# Altium footprint library vmorais_libraries.PcbLib: 80 footprints (part 4 of 5)
Each footprint in its own frame and in the unit in brackets; x right, y up, seen from the top. Pads: shape width x height; smd on the part's side, far side on the other; paste and mask are expansions set on the pad; w line width, h text height; cw(c..) or ccw(c..) is an arc to the next point about the centre after c.
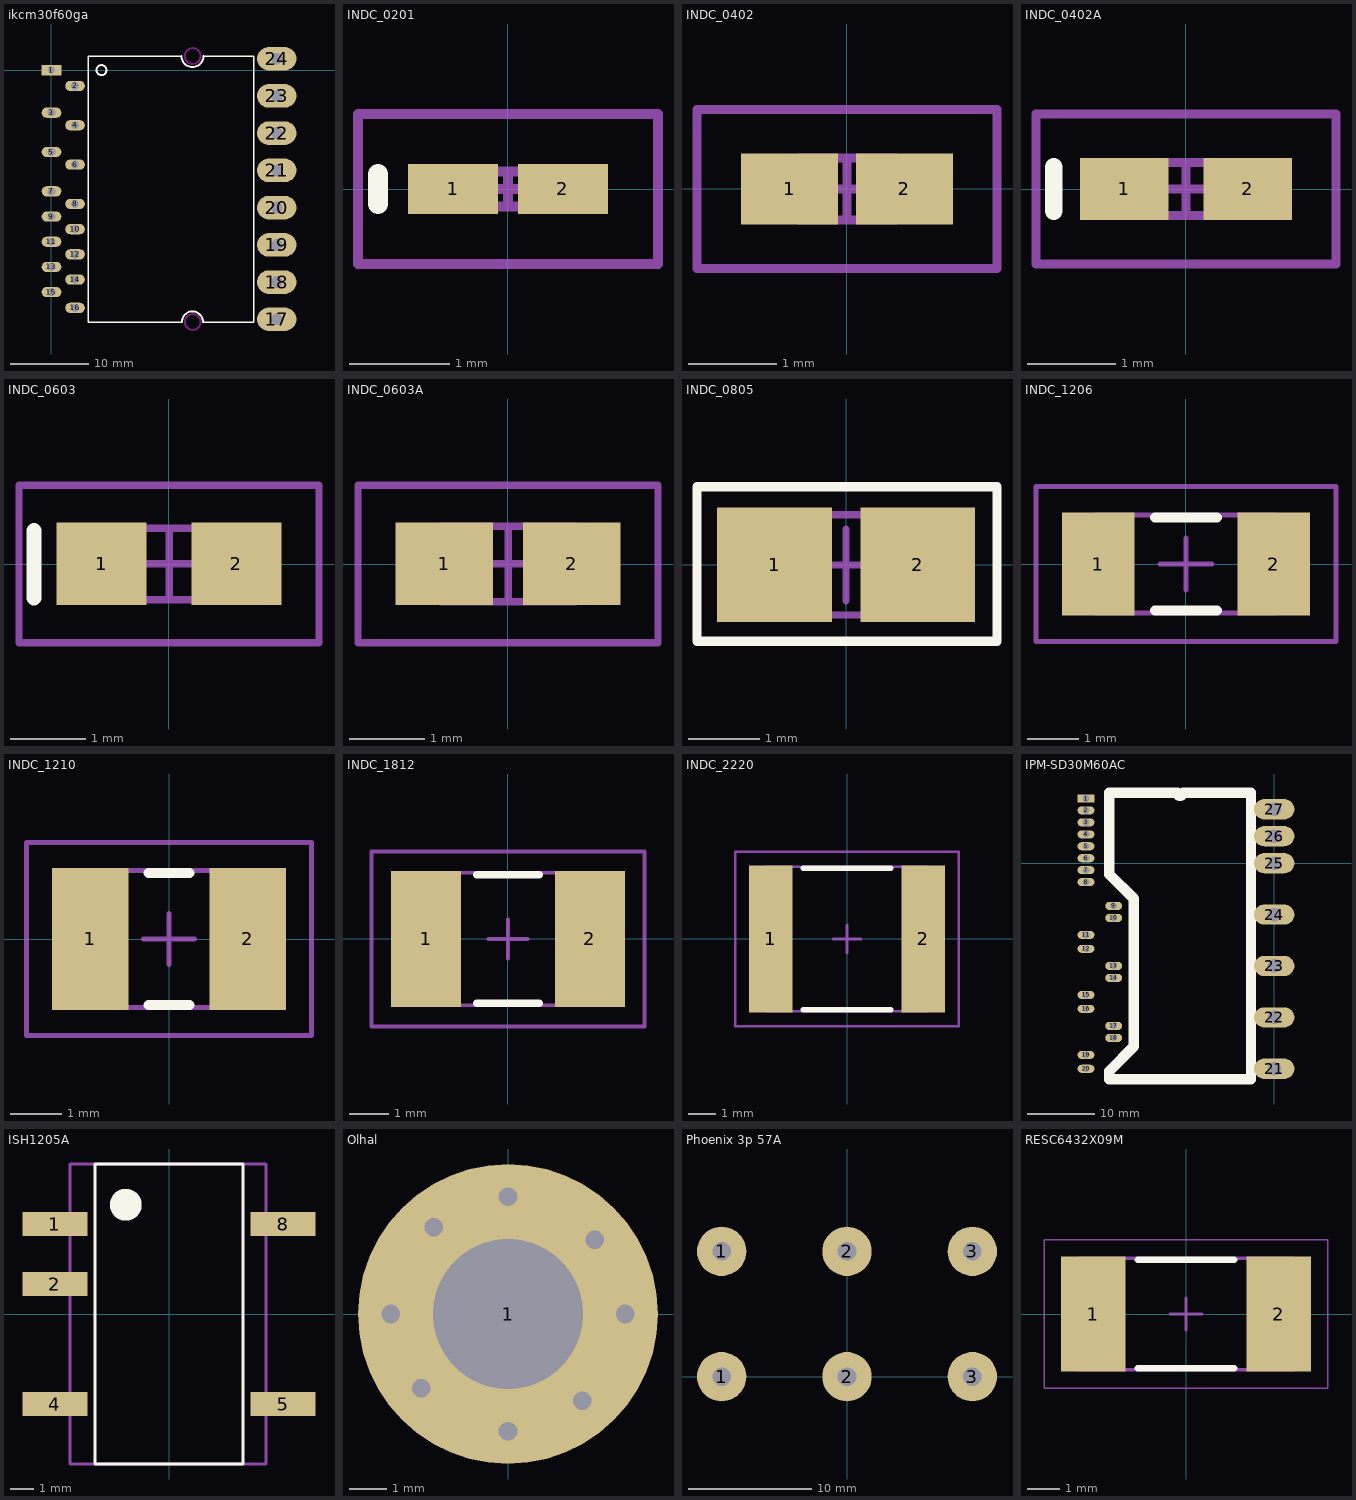
[diagram p3: the footprints below, top view; thin cyan lines are the x and y axes]

## ikcm30f60ga [mm]
pads (24):
  rect 2.5x1.3 hole 0.9: 1(0,0)
  oval 2.5x1.3 hole 1: 2(2.997,-2) 3(0,-5.4) 4(2.997,-7) 5(0,-10.4) 6(2.997,-12) 7(0,-15.4) 8(2.997,-17) 9(0,-18.6) 10(2.997,-20.2) 11(0,-21.8) 12(2.997,-23.4) 13(0,-25) 14(2.997,-26.6) 15(0,-28.2) 16(2.997,-30.2)
  oval 5x3 hole 1.5: 17(28.611,-31.655) 18(28.611,-26.925) 19(28.611,-22.195) 20(28.611,-17.465) 21(28.611,-12.735) 22(28.611,-8.005) 23(28.611,-3.275) 24(28.611,1.455)
Top Layer keep-out:
  circle w0.254: c17.95,1.8 r1
  circle w0.254: c17.95,-32 r1
Top Overlay:
  circle w0.254: c6.35,0 r0.635
  lines w0.2: 16.51,1.778 4.699,1.778 4.699,-32.004 16.557,-32.004 ; 19.257,-32.004 25.699,-32.004 25.699,1.778 19.304,1.778
  lines w0.254: 16.51,1.778 ccw(c17.907,1.778) 19.304,1.778 ; 16.557,-32.004 cw(c17.907,-32.004) 19.257,-32.004
3D body "User Library-Cipos-mini-PCB.STEP": height 1.3, standoff -6.4, extent -0.674,-33.198 29.159,3.102

## INDC_0201 [mm] "Chip Inductor, Body 0.6x0.3mm, IPC Low Density"
height 0.35
pads (2):
  rect 0.9x0.5 smd: 1(-0.55,0) 2(0.55,0)
Top Overlay:
  lines w0.2: -1.3,-0.15 -1.3,0.15
Mechanical 13:
  lines w0.1: -0.325,-0.175 -0.325,0.175 0.325,0.175 0.325,-0.175 -0.325,-0.175
Mechanical 15:
  lines w0.1: -0.175,0 0.175,0 ; 0,-0.175 0,0.175 ; -1.5,-0.75 -1.5,0.75 1.5,0.75 1.5,-0.75 -1.5,-0.75
3D body: height 0.35, standoff 0, extent -0.325,-0.175 0.325,0.175

## INDC_0402 [mm] "Chip Inductor, Body 1.0x0.5mm, IPC Low Density"
height 0.6
pads (2):
  rect 1.1x0.8 smd: 1(-0.65,0) 2(0.65,0)
Mechanical 13:
  lines w0.1: -0.55,-0.35 -0.55,0.35 0.55,0.35 0.55,-0.35 -0.55,-0.35
Mechanical 15:
  lines w0.1: -0.35,0 0.35,0 ; 0,-0.35 0,0.35 ; -1.7,-0.9 -1.7,0.9 1.7,0.9 1.7,-0.9 -1.7,-0.9
3D body: height 0.6, standoff 0, extent -0.55,-0.35 0.55,0.35

## INDC_0402A [mm] "Chip Inductor, Body 1.0x0.5mm, IPC Low Density"
height 0.55
pads (2):
  rect 1x0.7 smd: 1(-0.7,0) 2(0.7,0)
Top Overlay:
  lines w0.2: -1.5,-0.25 -1.5,0.25
Mechanical 13:
  lines w0.1: -0.55,-0.3 -0.55,0.3 0.55,0.3 0.55,-0.3 -0.55,-0.3
Mechanical 15:
  lines w0.1: -0.3,0 0.3,0 ; 0,-0.3 0,0.3 ; -1.7,-0.85 -1.7,0.85 1.7,0.85 1.7,-0.85 -1.7,-0.85
3D body: height 0.55, standoff 0, extent -0.55,-0.3 0.55,0.3

## INDC_0603 [mm] "Chip Inductor, Body 1.6x0.8mm, IPC Low Density"
height 0.71
pads (2):
  rect 1.2x1.1 smd: 1(-0.9,0) 2(0.9,0)
Top Overlay:
  lines w0.2: -1.8,-0.45 -1.8,0.45
Mechanical 13:
  lines w0.1: -0.875,-0.475 -0.875,0.475 0.875,0.475 0.875,-0.475 -0.875,-0.475
Mechanical 15:
  lines w0.1: -0.475,0 0.475,0 ; 0,-0.475 0,0.475 ; -2,-1.05 -2,1.05 2,1.05 2,-1.05 -2,-1.05
3D body: height 0.71, standoff 0, extent -0.875,-0.475 0.875,0.475

## INDC_0603A [mm] "Chip Inductor, Body 1.6x0.8mm, IPC Low Density"
height 1
pads (2):
  rect 1.3x1.1 smd: 1(-0.85,0) 2(0.85,0)
Mechanical 13:
  lines w0.1: -0.9,-0.5 0.9,-0.5 0.9,0.5 -0.9,0.5 -0.9,-0.5
Mechanical 15:
  lines w0.1: -0.5,0 0.5,0 ; 0,-0.5 0,0.5 ; -2,-1.05 2,-1.05 2,1.05 -2,1.05 -2,-1.05
3D body: height 1, standoff 0, extent -0.9,-0.5 0.9,0.5

## INDC_0805 [mm] "Chip Inductor, Body 2.0x1.2mm, IPC Low Density"
height 1.1
pads (2):
  rect 1.6x1.6 smd: 1(-1,0) 2(1,0)
Top Overlay:
  lines w0.127: -2.083,-1.067 -2.083,1.092 2.108,1.092 2.108,-1.067 -2.083,-1.067
Mechanical 13:
  lines w0.1: -1.1,-0.7 -1.1,0.7 1.1,0.7 1.1,-0.7 -1.1,-0.7
Mechanical 15:
  lines w0.1: -0.5,0 0.5,0 ; 0,-0.5 0,0.5
3D body: height 1.1, standoff 0, extent -1.1,-0.7 1.1,0.7

## INDC_1206 [mm] "Chip Inductor, Body 3.2x1.6mm, IPC Low Density"
height 1.9
pads (2):
  rect 1.4x2 smd: 1(-1.7,0) 2(1.7,0)
Top Overlay:
  lines w0.2: -0.6,-0.9 0.6,-0.9 ; -0.6,0.9 0.6,0.9
Mechanical 13:
  lines w0.1: -1.75,-0.95 1.75,-0.95 1.75,0.95 -1.75,0.95 -1.75,-0.95
Mechanical 15:
  lines w0.1: -0.5,0 0.5,0 ; 0,-0.5 0,0.5 ; -2.9,-1.5 2.9,-1.5 2.9,1.5 -2.9,1.5 -2.9,-1.5
3D body: height 1.9, standoff 0, extent -1.75,-0.95 1.75,0.95

## INDC_1210 [mm] "Chip Inductor, Body 3.2x2.5mm, IPC Low Density"
height 1.5
pads (2):
  rect 1.5x2.8 smd: 1(-1.55,0) 2(1.55,0)
Top Overlay:
  lines w0.2: -0.4,-1.3 0.4,-1.3 ; -0.4,1.3 0.4,1.3
Mechanical 13:
  lines w0.1: -1.7,-1.35 -1.7,1.35 1.7,1.35 1.7,-1.35 -1.7,-1.35
Mechanical 15:
  lines w0.1: -0.5,0 0.5,0 ; 0,-0.5 0,0.5 ; -2.8,-1.9 -2.8,1.9 2.8,1.9 2.8,-1.9 -2.8,-1.9
3D body: height 1.5, standoff 0, extent -1.7,-1.35 1.7,1.35

## INDC_1812 [mm] "Chip Inductor, Body 4.5x3.2mm, IPC Low Density"
height 1.35
pads (2):
  rect 1.8x3.5 smd: 1(-2.1,0) 2(2.1,0)
Top Overlay:
  lines w0.2: -0.8,-1.65 0.8,-1.65 ; -0.8,1.65 0.8,1.65
Mechanical 13:
  lines w0.1: -2.4,-1.7 2.4,-1.7 2.4,1.7 -2.4,1.7 -2.4,-1.7
Mechanical 15:
  lines w0.1: -0.5,0 0.5,0 ; 0,-0.5 0,0.5 ; -3.5,-2.25 3.5,-2.25 3.5,2.25 -3.5,2.25 -3.5,-2.25
3D body: height 1.35, standoff 0, extent -2.4,-1.7 2.4,1.7

## INDC_2220 [mm] "Chip Inductor, Body 5.7x5.0mm, IPC Low Density"
height 1.9
pads (2):
  rect 1.6x5.4 smd: 1(-2.8,0) 2(2.8,0)
Top Overlay:
  lines w0.2: -1.6,-2.6 1.6,-2.6 ; -1.6,2.6 1.6,2.6
Mechanical 13:
  lines w0.1: -2.95,-2.65 2.95,-2.65 2.95,2.65 -2.95,2.65 -2.95,-2.65
Mechanical 15:
  lines w0.1: -0.5,0 0.5,0 ; 0,-0.5 0,0.5 ; -4.1,-3.2 4.1,-3.2 4.1,3.2 -4.1,3.2 -4.1,-3.2
3D body: height 1.9, standoff 0, extent -2.95,-2.65 2.95,2.65

## IPM-SD30M60AC [mm]
pads (27):
  rect 2.5x1.2 hole 1: 1(-27.9,9.588)
  oval 2.5x1.2 hole 1: 2(-27.9,7.818) 3(-27.9,6.048) 4(-27.9,4.278) 5(-27.9,2.508) 6(-27.9,0.738) 7(-27.9,-1.032) 8(-27.9,-2.802) 9(-23.8,-6.342) 10(-23.8,-8.112) 11(-27.9,-10.643) 12(-27.9,-12.693) 13(-23.8,-15.224) 14(-23.8,-17.002) 15(-27.9,-19.54) 16(-27.9,-21.59) 17(-23.8,-24.121) 18(-23.8,-25.899) 19(-27.9,-28.43) 20(-27.9,-30.48)
  oval 6x3 hole 2: 21(0,-30.48) 22(0,-22.86) 23(0,-15.24) 24(0,-7.62) 25(0,0) 26(0,4) 27(0,8)
Top Overlay:
  lines w1.553: -24.462,-32.007 -24.462,-30.834 -20.788,-27.16 -20.788,-22.588 -20.788,-18.778 -20.788,-13.444 -20.788,-9.126 -20.788,-5.282 -24.462,-1.608 -24.462,10.473 -14.392,10.473 ccw(c-13.95,10.473) -13.508,10.473 -3.438,10.473 -3.438,-32.007 -24.462,-32.007
3D body: height 5, standoff 1, extent -25.908,-32.766 -2.286,10.922

## ISH1205A [mm] "Isolated Module DC DC Converter 1 Output 5V 400mA 10.8V - 13.2V Input"
height 4.85
pads (5):
  rect 2.75x1 smd: 1(-4.83,3.81) 2(-4.83,1.27) 4(-4.83,-3.81) 5(4.83,-3.81) 8(4.83,3.81)
Top Overlay:
  circle w0.75: c-1.829,4.623 r0.3
  lines w0.127: -3.124,-6.35 -3.124,6.35 3.124,6.35 3.124,-6.35 -3.124,-6.35
Mechanical 1:
  lines w0.127: -4.195,-6.35 4.111,-6.35 4.111,6.35 -4.195,6.35 -4.195,-6.35
3D body: height 7.25, standoff 0, extent -4.195,-6.35 4.111,6.35

## Olhal [mm]
pads (1):
  round 8 hole 4 unplated: 1(0,0)
via 1.981,-2.311 diameter 0.6 hole 0.5
via -2.311,-1.981 diameter 0.6 hole 0.5
via -1.981,2.311 diameter 0.6 hole 0.5
via 2.311,1.981 diameter 0.6 hole 0.5
via 3.124,0 diameter 0.6 hole 0.5
via 0,-3.124 diameter 0.6 hole 0.5
via -3.124,0 diameter 0.6 hole 0.5
via 0,3.124 diameter 0.6 hole 0.5

## Phoenix 3p 57A [mm]
pads (6):
  round 4 hole 1.5: 1(-10.16,0) 1(-10.16,10.16) 2(0,0) 2(0,10.16) 3(10.16,0) 3(10.16,10.16)
3D body "1929520_01.stp": height 31.25, standoff -4.5, extent -15.363,-3.407 15.972,18.593

## RESC6432X09M [mm] "Chip Resistor, 2-Leads, Body 6,40x3,20mm, IPC Low Density"
height 0.9
pads (2):
  rect 2x3.55 smd: 1(-2.875,0) 2(2.875,0)
Top Overlay:
  lines w0.2: -1.5,-1.675 1.5,-1.675 ; -1.5,1.675 1.5,1.675
Mechanical 13:
  lines w0.1: -3.325,-1.725 3.325,-1.725 3.325,1.725 -3.325,1.725 -3.325,-1.725
Mechanical 15:
  lines w0.05: -4.4,-2.3 4.4,-2.3 4.4,2.3 -4.4,2.3 -4.4,-2.3
  lines w0.1: -0.5,0 0.5,0 ; 0,-0.5 0,0.5
3D body "RESC6432X09M.step": height 0.9, standoff 0, extent -3.325,-1.725 3.325,1.725